# Altium schematic symbol library FPGA_Xilinx_Virtex6.SchLib: 28 symbols (part 17 of 21) (continued)
## XC6VLX760-FF1760 (continued)
part M pins: AC10 IO_L2P_43 (io), AC11 IO_L2N_43 (io), AD5 IO_L0N_43 (io), AD6 IO_L0P_43 (io), AD7 IO_L9N_MRCC_43 (io), AD8 IO_L11P_SRCC_43 (io), AD9 VCCO_43 (power), AD10 IO_L13P_43 (io), AD11 IO_L13N_43 (io), AE4 IO_L4N_VREF_43 (io), AE5 IO_L5N_43 (io), AE6 VCCO_43 (power), AE7 IO_L9P_MRCC_43 (io), AE8 IO_L11N_SRCC_43 (io), AE9 IO_L17N_43 (io), AE10 IO_L17P_43 (io), AF1 IO_L1N_43 (io), AF2 IO_L3N_43 (io), AF3 VCCO_43 (power), AF4 IO_L4P_43 (io), AF5 IO_L5P_43 (io), AF6 IO_L15N_43 (io), AF7 IO_L15P_43 (io), AF9 IO_L8N_SRCC_43 (io), AF10 IO_L8P_SRCC_43 (io), AF11 IO_L19N_43 (io), AF12 IO_L19P_43 (io), AG1 IO_L1P_43 (io), AG2 IO_L3P_43 (io), AG3 IO_L14N_VREF_43 (io), AG4 IO_L10N_MRCC_43 (io), AG6 IO_L6N_43 (io), AG7 IO_L6P_43 (io), AG8 IO_L12N_VRP_43 (io), AG9 IO_L12P_VRN_43 (io), AG10 VCCO_43 (power), AG11 IO_L18N_43 (io), AG12 IO_L18P_43 (io), AH1 IO_L7P_43 (io), AH3 IO_L14P_43 (io), AH4 IO_L10P_MRCC_43 (io), AH5 IO_L0N_42 (io), AH6 IO_L0P_42 (io), AH7 VCCO_42 (power), AH8 IO_L19P_42 (io), AH9 IO_L14N_VREF_42 (io), AH10 IO_L14P_42 (io), AJ1 IO_L7N_43 (io), AJ2 IO_L16N_43 (io), AJ3 IO_L16P_43 (io), AJ4 VCCO_42 (power), AJ5 IO_L5N_42 (io), AJ6 IO_L5P_42 (io), AJ7 IO_L19N_42 (io), AJ8 IO_L15P_42 (io), AK1 VCCO_43 (power), AK2 IO_L1N_42 (io), AK3 IO_L3N_42 (io), AK4 IO_L6N_42 (io), AK5 IO_L10N_MRCC_42 (io), AK7 IO_L15N_42 (io), AL1 IO_L1P_42 (io), AL2 IO_L3P_42 (io), AL4 IO_L6P_42 (io), AL5 IO_L10P_MRCC_42 (io), AL6 IO_L18N_42 (io), AM1 IO_L7P_42 (io), AM2 IO_L7N_42 (io), AM3 IO_L13N_42 (io), AM4 IO_L13P_42 (io), AM5 VCCO_42 (power), AM6 IO_L18P_42 (io), AN1 IO_L9N_MRCC_42 (io), AN2 VCCO_42 (power), AN3 IO_L11N_SRCC_42 (io), AN4 IO_L17P_42 (io), AN5 IO_L17N_42 (io), AP1 IO_L9P_MRCC_42 (io), AP2 IO_L2N_42 (io), AP3 IO_L11P_SRCC_42 (io), AR2 IO_L2P_42 (io), AR3 IO_L16N_42 (io), AR4 IO_L16P_42 (io), AT1 IO_L4N_VREF_42 (io), AT2 IO_L4P_42 (io), AT3 VCCO_42 (power), AU1 IO_L8N_SRCC_42 (io), AU2 IO_L12N_VRP_42 (io), AU3 IO_L12P_VRN_42 (io), AV1 IO_L8P_SRCC_42 (io)
part N pins: AA1 IO_L7P_44 (io), AA2 IO_L7N_44 (io), AA4 IO_L5P_44 (io), AA5 IO_L5N_44 (io), AA6 IO_L0P_44 (io), AA7 IO_L0N_44 (io), AA8 VCCO_44 (power), AA9 IO_L19P_44 (io), AA10 IO_L17P_44 (io), AA11 IO_L11N_SRCC_44 (io), AB1 IO_L8P_SRCC_44 (io), AB2 IO_L8N_SRCC_44 (io), AB3 IO_L6N_44 (io), AB4 IO_L10N_MRCC_44 (io), AB5 VCCO_44 (power), AB6 IO_L15N_44 (io), AB7 IO_L15P_44 (io), AB8 IO_L2N_44 (io), AB9 IO_L2P_44 (io), AB11 IO_L17N_44 (io), AC1 IO_L16N_44 (io), AC2 VCCO_44 (power), AC3 IO_L6P_44 (io), AC4 IO_L10P_MRCC_44 (io), AC5 IO_L4N_VREF_44 (io), AC6 IO_L4P_44 (io), AC8 IO_L12N_VRP_44 (io), AC9 IO_L12P_VRN_44 (io), AD1 IO_L16P_44 (io), AD2 IO_L14N_VREF_44 (io), AD3 IO_L14P_44 (io), AE2 IO_L18N_44 (io), AE3 IO_L18P_44 (io), M1 IO_L1N_45 (io), N1 IO_L1P_45 (io), N2 VCCO_45 (power), P1 IO_L17P_45 (io), P2 IO_L3P_45 (io), P3 IO_L3N_45 (io), R2 IO_L17N_45 (io), R3 IO_L11P_SRCC_45 (io), R4 IO_L0P_45 (io), R5 IO_L0N_45 (io), T1 IO_L16P_45 (io), T2 IO_L16N_45 (io), T3 VCCO_45 (power), T4 IO_L11N_SRCC_45 (io), T5 IO_L5N_45 (io), T6 IO_L9P_MRCC_45 (io), T7 IO_L9N_MRCC_45 (io), U1 IO_L18N_45 (io), U2 IO_L14P_45 (io), U3 IO_L14N_VREF_45 (io), U4 IO_L4N_VREF_45 (io), U6 IO_L5P_45 (io), U7 IO_L19N_45 (io), U8 IO_L13P_45 (io), U9 IO_L13N_45 (io), U10 VCCO_45 (power), U11 IO_L7P_45 (io), V1 IO_L18P_45 (io), V3 IO_L6N_45 (io), V4 IO_L4P_45 (io), V5 IO_L10P_MRCC_45 (io), V6 IO_L10N_MRCC_45 (io), V7 VCCO_45 (power), V8 IO_L19P_45 (io), V9 IO_L2P_45 (io), V10 IO_L2N_45 (io), V11 IO_L7N_45 (io), W1 IO_L1P_44 (io), W2 IO_L1N_44 (io), W3 IO_L6P_45 (io), W4 VCCO_45 (power), W5 IO_L15N_45 (io), W6 IO_L15P_45 (io), W7 IO_L8N_SRCC_45 (io), W8 IO_L8P_SRCC_45 (io), W10 IO_L12N_VRP_45 (io), W11 IO_L12P_VRN_45 (io), Y1 VCCO_44 (power), Y2 IO_L3N_44 (io), Y3 IO_L3P_44 (io), Y4 IO_L13N_44 (io), Y5 IO_L13P_44 (io), Y7 IO_L9P_MRCC_44 (io), Y8 IO_L9N_MRCC_44 (io), Y9 IO_L19N_44 (io), Y10 IO_L11P_SRCC_44 (io), Y11 VCCO_44 (power)
part O pins: A2 IO_L3N_47 (io), A4 IO_L1N_47 (io), B1 IO_L16P_47 (io), B2 IO_L16N_47 (io), B3 IO_L3P_47 (io), B4 IO_L1P_47 (io), B5 VCCO_47 (power), C1 IO_L18P_47 (io), C2 VCCO_47 (power), C3 IO_L9P_MRCC_47 (io), C4 IO_L9N_MRCC_47 (io), C5 IO_L7P_47 (io), D1 IO_L1P_46 (io), D2 IO_L18N_47 (io), D3 IO_L14N_VREF_47 (io), D5 IO_L7N_47 (io), E2 IO_L1N_46 (io), E3 IO_L14P_47 (io), E4 IO_L10N_MRCC_47 (io), E5 IO_L5N_47 (io), F1 IO_L3P_46 (io), F2 IO_L3N_46 (io), F3 VCCO_46 (power), F4 IO_L10P_MRCC_47 (io), F5 IO_L5P_47 (io), G1 IO_L8P_SRCC_46 (io), G2 IO_L8N_SRCC_46 (io), G3 IO_L7P_46 (io), G4 IO_L6N_47 (io), H1 IO_L16N_46 (io), H3 IO_L7N_46 (io), H4 IO_L6P_47 (io), H5 IO_L2P_47 (io), H6 IO_L2N_47 (io), J1 IO_L16P_46 (io), J2 IO_L19P_46 (io), J3 IO_L19N_46 (io), J4 VCCO_47 (power), J5 IO_L15N_47 (io), J6 IO_L0P_47 (io), K1 VCCO_46 (power), K2 IO_L6N_46 (io), K3 IO_L9P_MRCC_46 (io), K4 IO_L9N_MRCC_46 (io), K5 IO_L15P_47 (io), K7 IO_L0N_47 (io), L1 IO_L18P_46 (io), L2 IO_L6P_46 (io), L4 IO_L4P_46 (io), L5 IO_L0P_46 (io), L6 IO_L12P_VRN_47 (io), L7 IO_L8N_SRCC_47 (io), L8 VCCO_47 (power), L9 IO_L13N_47 (io), M2 IO_L18N_46 (io), M3 IO_L14N_VREF_46 (io), M4 IO_L4N_VREF_46 (io), M5 VCCO_46 (power), M6 IO_L0N_46 (io), M7 IO_L12N_VRP_47 (io), M8 IO_L8P_SRCC_47 (io), M9 IO_L13P_47 (io), M11 IO_L17P_47 (io), N3 IO_L14P_46 (io), N4 IO_L10N_MRCC_46 (io), N5 IO_L5P_46 (io), N6 IO_L5N_46 (io), N8 IO_L11P_SRCC_46 (io), N9 IO_L4P_47 (io), N10 IO_L4N_VREF_47 (io), N11 IO_L17N_47 (io), N12 VCCO_47 (power), N13 IO_L11P_SRCC_47 (io), P5 IO_L10P_MRCC_46 (io), P6 IO_L15N_46 (io), P7 IO_L11N_SRCC_46 (io), P8 IO_L17P_46 (io), P9 VCCO_46 (power), P10 IO_L13N_46 (io), P11 IO_L19P_47 (io), P12 IO_L19N_47 (io), P13 IO_L11N_SRCC_47 (io), R6 VCCO_46 (power), R7 IO_L15P_46 (io), R8 IO_L17N_46 (io), R9 IO_L13P_46 (io), R10 IO_L2N_46 (io), T9 IO_L2P_46 (io), T10 IO_L12N_VRP_46 (io), T11 IO_L12P_VRN_46 (io)
part P pins: AA21 VREFN_0 (io), AA22 VP_0 (io), AB21 VN_0 (io), AB22 VREFP_0 (io), AC21 DXN_0 (io), AC22 DXP_0 (io), AD31 RDWR_B_0 (io), AE12 TMS_0 (io), AF13 CCLK_0 (io), AF14 TDI_0 (io), AF29 DIN_0 (io), AF30 CSI_B_0 (io), AH13 TDO_0 (io), AH14 TCK_0 (io), AH28 DOUT_BUSY_0 (io), R14 INIT_B_0 (io), R16 VCCO_0 (power), R29 M1_0 (io), R30 M0_0 (io), T14 DONE_0 (io), T15 HSWAPEN_0 (io), T29 M2_0 (io), T30 PROGRAM_B_0 (io), U15 VCCO_0 (power)
part Q pins: A3 GND (power), A13 GND (power), A23 GND (power), A33 GND (power), AA12 VCCAUX (power), AA14 VCCINT (power), AA16 VCCINT (power), AA18 VCCINT (power), AA20 VCCINT (power), AA24 VCCINT (power), AA26 VCCINT (power), AA28 VCCINT (power), AA30 VCCAUX (power), AB13 VCCAUX (power), AB15 VCCINT (power), AB17 VCCINT (power), AB19 VCCINT (power), AB23 VCCINT (power), AB25 VCCINT (power), AB27 VCCINT (power), AB29 VCCAUX (power), AB31 VCCAUX (power), AC12 VCCAUX (power), AC14 VCCINT (power), AC16 VCCINT (power), AC18 VCCINT (power), AC20 VCCINT (power), AC24 VCCINT (power), AC26 VCCINT (power), AC28 VCCINT (power), AC30 VCCAUX (power), AD13 VCCAUX (power), AD15 VCCINT (power), AD17 VCCINT (power), AD19 VCCINT (power), AD21 VCCINT (power), AD23 VCCINT (power), AD25 VCCINT (power), AD27 VCCINT (power), AD29 VCCAUX (power), AE14 VCCINT (power), AE16 VCCINT (power), AE18 VCCINT (power), AE20 VCCINT (power), AE22 VCCINT (power), AE24 VCCINT (power), AE26 VCCINT (power), AE28 VCCINT (power), AE30 VCCAUX (power), AF15 VCCINT (power), AF17 VCCINT (power), AF19 VCCINT (power), AF21 VCCINT (power), AF23 VCCINT (power), AF25 VCCINT (power), AF27 VCCINT (power), AG14 VCCINT (power), AG16 VCCINT (power), AG18 VCCINT (power), AG20 VCCINT (power), AG22 VCCINT (power), AG24 VCCINT (power), AG26 VCCINT (power), AG28 VCCINT (power), AG29 VFS_0 (power), AH15 VCCINT (power), AH17 VCCINT (power), AH19 VCCINT (power), AH21 VCCINT (power), AH23 VCCINT (power), AH25 VCCINT (power), AH27 VCCINT (power), B10 GND (power), B20 GND (power), B30 GND (power), B40 GND (power), C7 GND (power), C17 GND (power), C27 GND (power), C37 GND (power), D4 GND (power), D14 GND (power), D24 GND (power), D34 GND (power), E1 GND (power), E11 GND (power), E21 GND (power), E31 GND (power), E41 GND (power), F8 GND (power), F18 GND (power), F28 GND (power), F38 GND (power), G5 GND (power), G15 GND (power), G25 GND (power), G35 GND (power), H2 GND (power), H12 GND (power), H22 GND (power), H32 GND (power), H42 GND (power), J9 GND (power), J19 GND (power), J29 GND (power), J39 GND (power), K6 GND (power), K16 GND (power), K26 GND (power), K36 GND (power), L3 GND (power), L13 GND (power), L23 GND (power), L33 GND (power), M10 GND (power), M20 GND (power), M30 GND (power), M40 GND (power), N7 GND (power), N17 GND (power), N27 GND (power), N37 GND (power), P4 GND (power), P14 GND (power), P24 GND (power), P34 GND (power), R1 GND (power), R11 GND (power), R12 VCCAUX (power), R13 GND (power), R18 VCCINT (power), R19 GND (power), R20 VCCINT (power), R21 GND (power), R22 VCCINT (power), R23 GND (power), R24 VCCINT (power), R31 GND (power), R41 GND (power), T8 GND (power), T12 GND (power), T13 VCCAUX (power), T16 GND (power), T17 VCCINT (power), T18 GND (power), T19 VCCINT (power), T20 GND (power), T21 VCCINT (power), T22 GND (power), T23 VCCINT (power), T24 GND (power), T25 VCCINT (power), T26 GND (power), T27 VCCINT (power), T28 GND (power), T38 GND (power), U5 GND (power), U12 VCCAUX (power), U13 GND (power), U14 VBATT_0 (power), U16 VCCINT (power), U17 GND (power), U18 VCCINT (power), U19 GND (power), U20 VCCINT (power), U21 GND (power), U22 VCCINT (power), U23 GND (power), U24 VCCINT (power), U25 GND (power), U26 VCCINT (power), U27 GND (power), U28 VCCINT (power), U29 GND (power), U30 VCCAUX (power), U35 GND (power), V2 GND (power), V12 GND (power), V13 VCCAUX (power), V14 GND (power), V15 VCCINT (power), V16 GND (power), V17 VCCINT (power), V18 GND (power), V19 VCCINT (power), V20 GND (power), V21 VCCINT (power), V22 GND (power), V23 VCCINT (power), V24 GND (power), V25 VCCINT (power), V26 GND (power), V27 VCCINT (power), V28 GND (power), V29 VCCAUX (power), V30 GND (power), V31 VCCAUX (power), V32 GND (power), V42 GND (power), W9 GND (power), W12 VCCAUX (power), W14 VCCINT (power), W16 VCCINT (power), W18 VCCINT (power), W20 VCCINT (power), W22 VCCINT (power), W24 VCCINT (power), W26 VCCINT (power), W28 VCCINT (power), W30 VCCAUX (power), Y13 VCCAUX (power), Y15 VCCINT (power), Y17 VCCINT (power), Y19 VCCINT (power), Y21 AVSS_0 (power), Y22 AVDD_0 (power), Y23 VCCINT (power), Y25 VCCINT (power), Y27 VCCINT (power), Y29 VCCINT (power), Y31 VCCAUX (power)
part R pins: AA3 GND (power), AA13 GND (power), AA15 GND (power), AA17 GND (power), AA19 GND (power), AA23 GND (power), AA25 GND (power), AA27 GND (power), AA29 GND (power), AA31 GND (power), AA33 GND (power), AB10 GND (power), AB12 GND (power), AB14 GND (power), AB16 GND (power), AB18 GND (power), AB20 GND (power), AB24 GND (power), AB26 GND (power), AB28 GND (power), AB30 GND (power), AB40 GND (power), AC7 GND (power), AC13 GND (power), AC15 GND (power), AC17 GND (power), AC19 GND (power), AC23 GND (power), AC25 GND (power), AC27 GND (power), AC29 GND (power), AC31 GND (power), AC37 GND (power), AD4 GND (power), AD12 GND (power), AD14 GND (power), AD16 GND (power), AD18 GND (power), AD20 GND (power), AD22 GND (power), AD24 GND (power), AD26 GND (power), AD28 GND (power), AD30 GND (power), AD34 GND (power), AE1 GND (power), AE11 GND (power), AE13 GND (power), AE15 GND (power), AE17 GND (power), AE19 GND (power), AE21 GND (power), AE23 GND (power), AE25 GND (power), AE27 GND (power), AE29 GND (power), AE31 GND (power), AE41 GND (power), AF8 GND (power), AF16 GND (power), AF18 GND (power), AF20 GND (power), AF22 GND (power), AF24 GND (power), AF26 GND (power), AF28 GND (power), AF38 GND (power), AG5 GND (power), AG13 GND (power), AG15 GND (power), AG17 GND (power), AG19 GND (power), AG21 GND (power), AG23 GND (power), AG25 GND (power), AG27 GND (power), AG35 GND (power), AH2 GND (power), AH12 GND (power), AH18 GND (power), AH20 GND (power), AH22 GND (power), AH24 GND (power), AH32 GND (power), AH42 GND (power), AJ9 GND (power), AJ19 GND (power), AJ29 GND (power), AJ39 GND (power), AK6 GND (power), AK16 GND (power), AK26 GND (power), AK36 GND (power), AL3 GND (power), AL13 GND (power), AL23 GND (power), AL33 GND (power), AM10 GND (power), AM20 GND (power), AM30 GND (power), AM40 GND (power), AN7 GND (power), AN17 GND (power), AN27 GND (power), AN37 GND (power), AP4 GND (power), AP14 GND (power), AP24 GND (power), AP34 GND (power), AR1 GND (power), AR11 GND (power), AR21 GND (power), AR31 GND (power), AR41 GND (power), AT8 GND (power), AT18 GND (power), AT28 GND (power), AT38 GND (power), AU5 GND (power), AU15 GND (power), AU25 GND (power), AU35 GND (power), AV2 GND (power), AV12 GND (power), AV22 GND (power), AV32 GND (power), AV42 GND (power), AW9 GND (power), AW19 GND (power), AW29 GND (power), AW39 GND (power), AY6 GND (power), AY16 GND (power), AY26 GND (power), AY36 GND (power), BA3 GND (power), BA13 GND (power), BA23 GND (power), BA33 GND (power), BB10 GND (power), BB20 GND (power), BB30 GND (power), BB40 GND (power), W13 GND (power), W15 GND (power), W17 GND (power), W19 GND (power), W21 GND (power), W23 GND (power), W25 GND (power), W27 GND (power), W29 GND (power), W31 GND (power), W39 GND (power), Y6 GND (power), Y12 GND (power), Y14 GND (power), Y16 GND (power), Y18 GND (power), Y20 GND (power), Y24 GND (power), Y26 GND (power), Y28 GND (power), Y30 GND (power), Y36 GND (power)

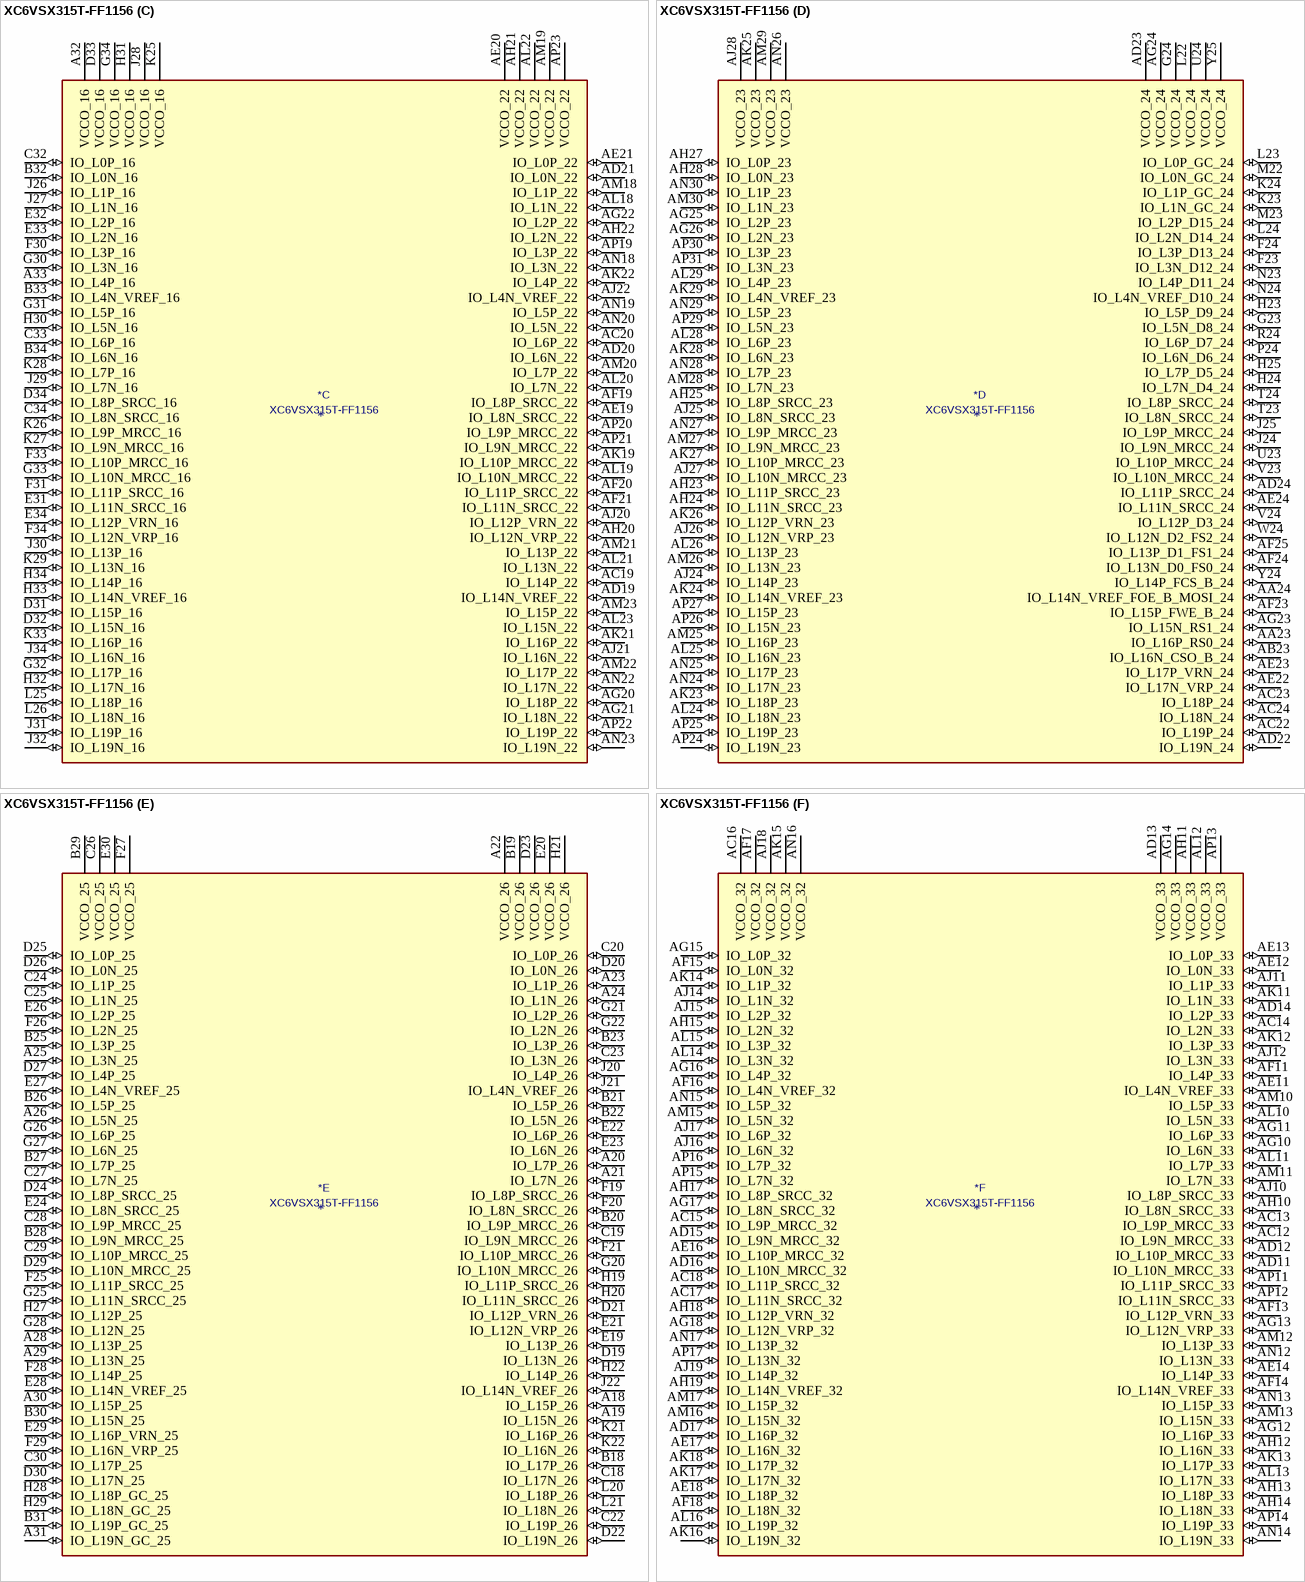
[diagram p86: symbol XC6VSX315T-FF1156]

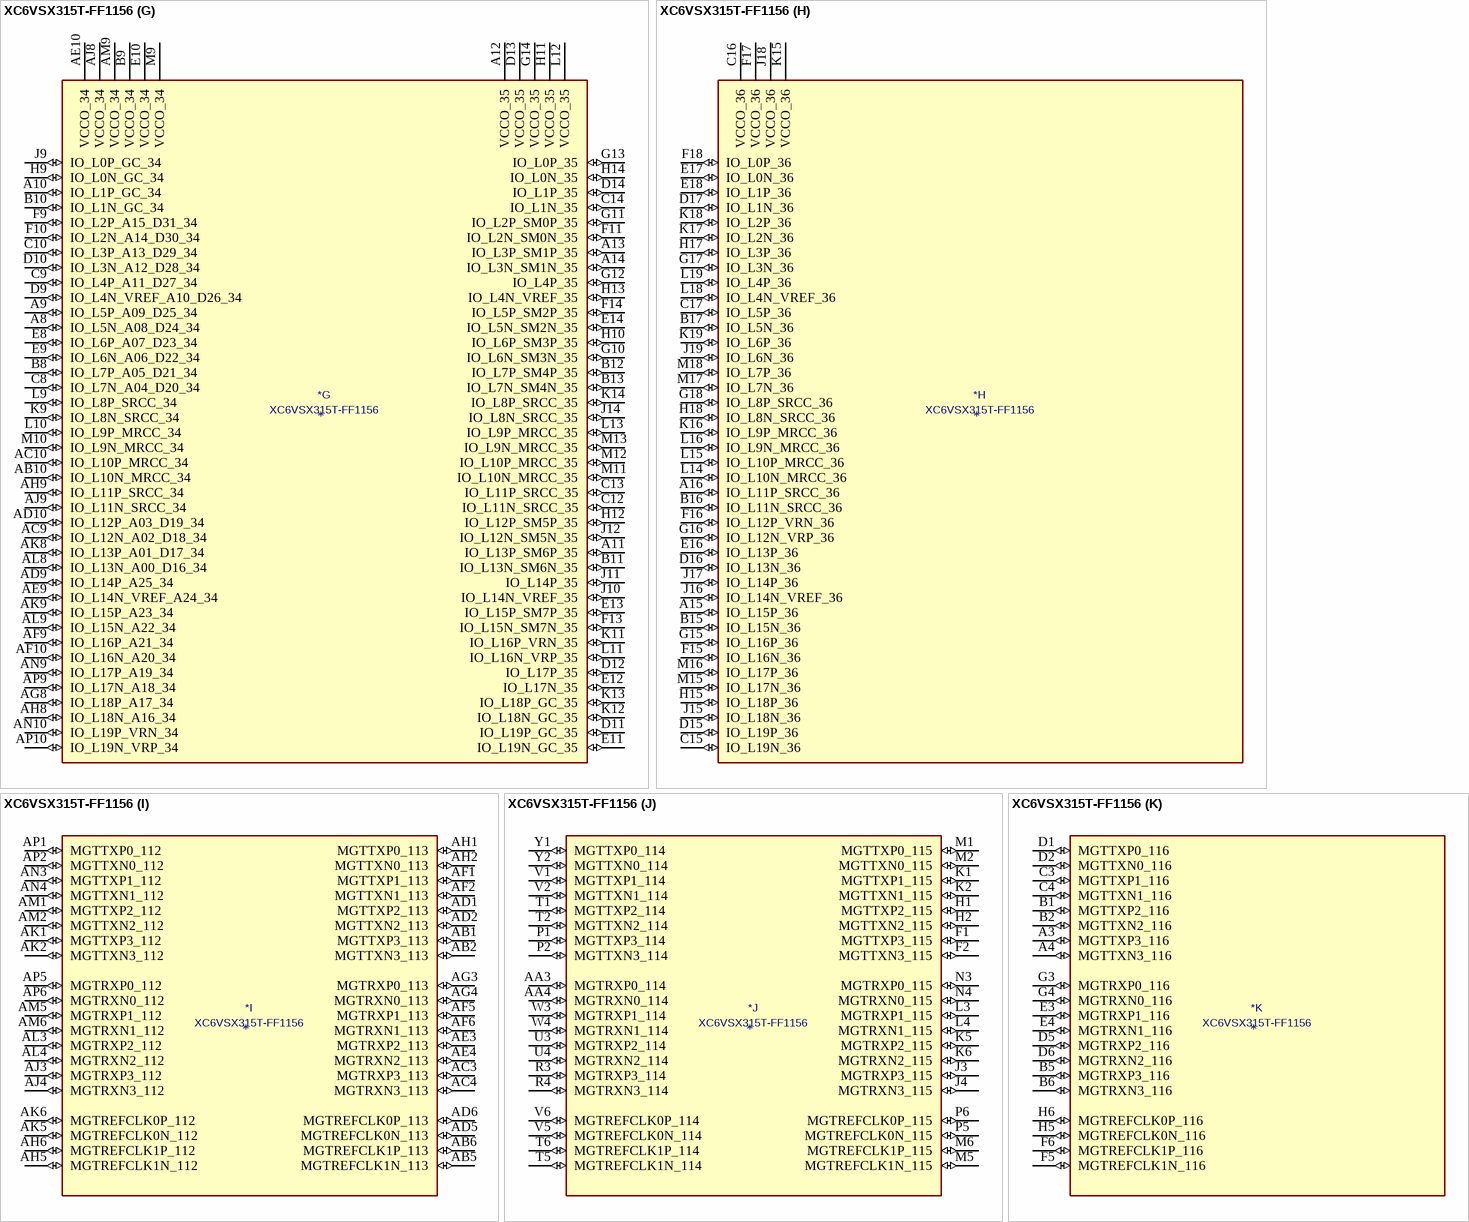
[diagram p87: symbol XC6VSX315T-FF1156]

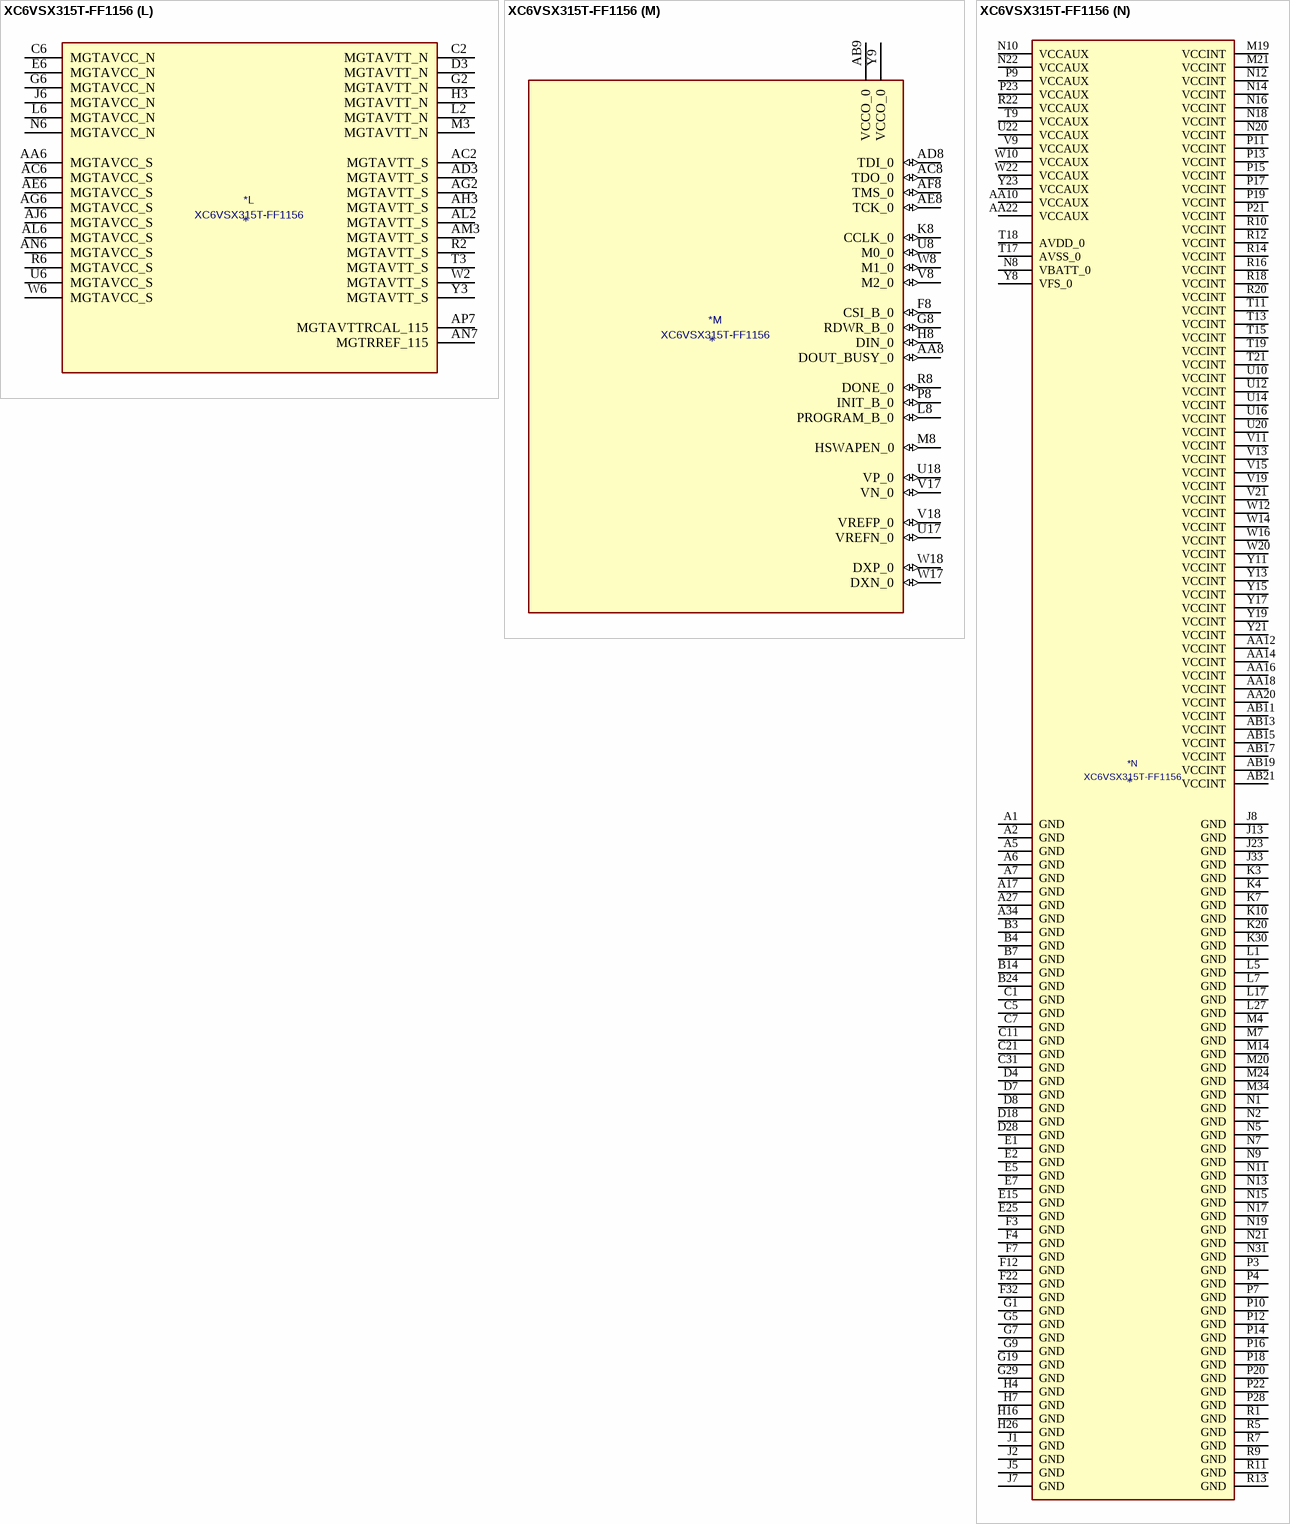
[diagram p88: symbol XC6VSX315T-FF1156]

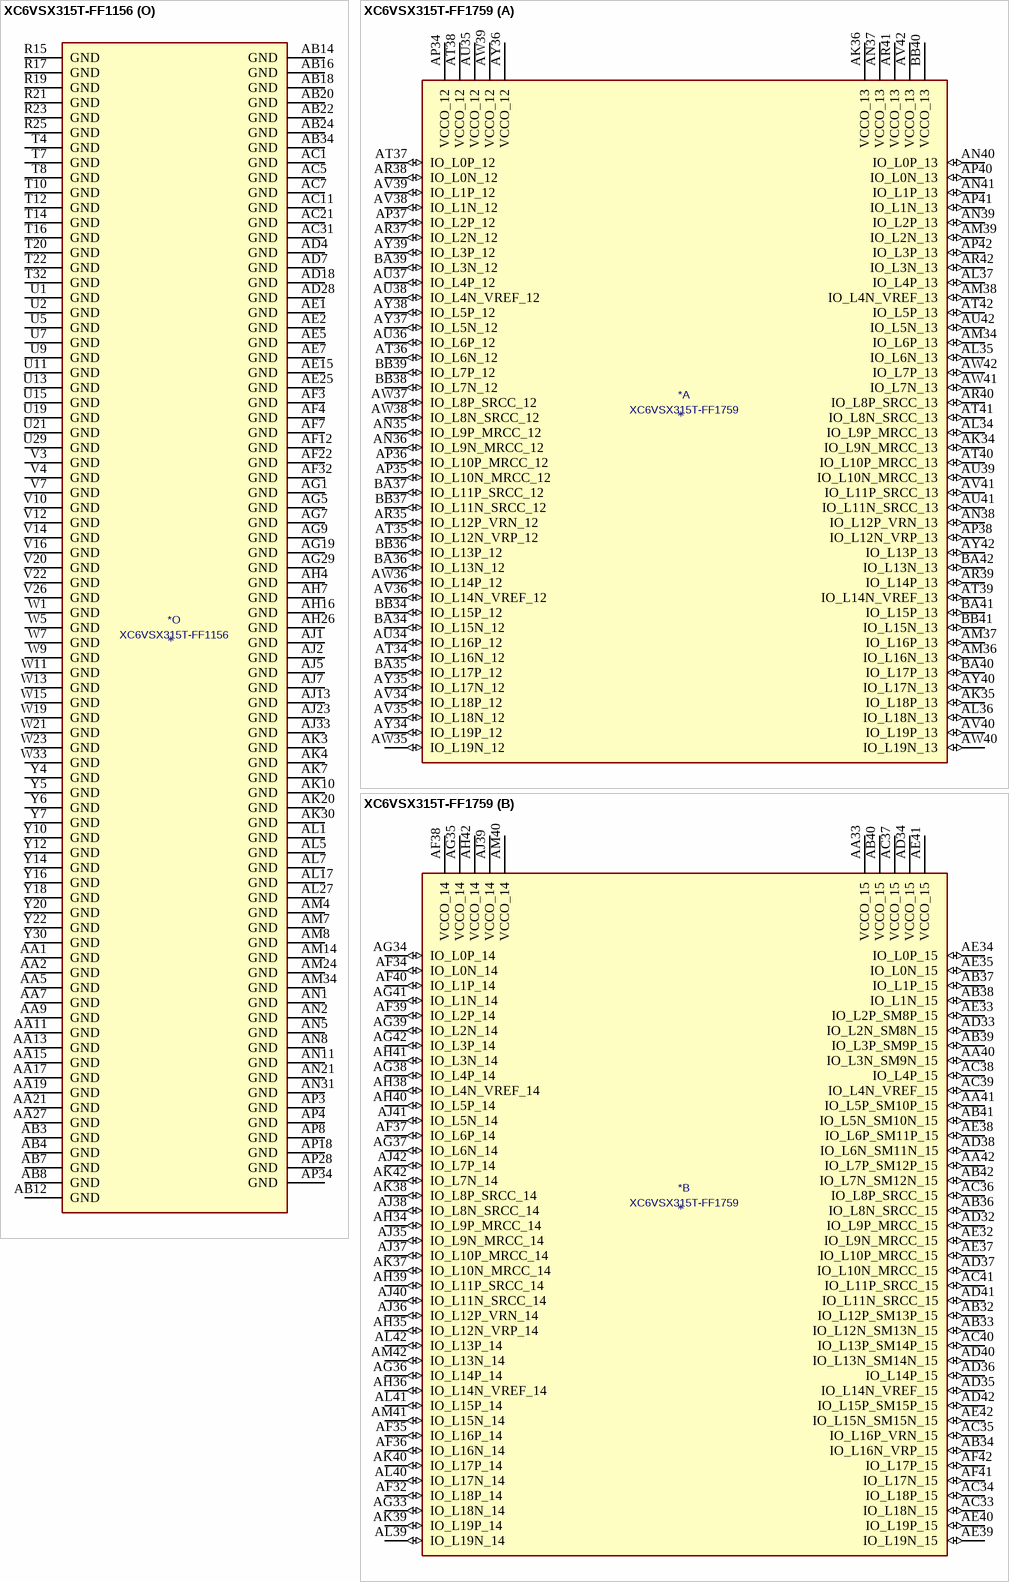
[diagram p89: symbols XC6VSX315T-FF1156 to XC6VSX315T-FF1759]